# Altium footprint library OneBoxLib_RCL.PcbLib: 50 footprints (part 1 of 4)
Each footprint in its own frame and in the unit in brackets; x right, y up, seen from the top. Pads: shape width x height; smd on the part's side, far side on the other; paste and mask are expansions set on the pad; w line width, h text height; cw(c..) or ccw(c..) is an arc to the next point about the centre after c.
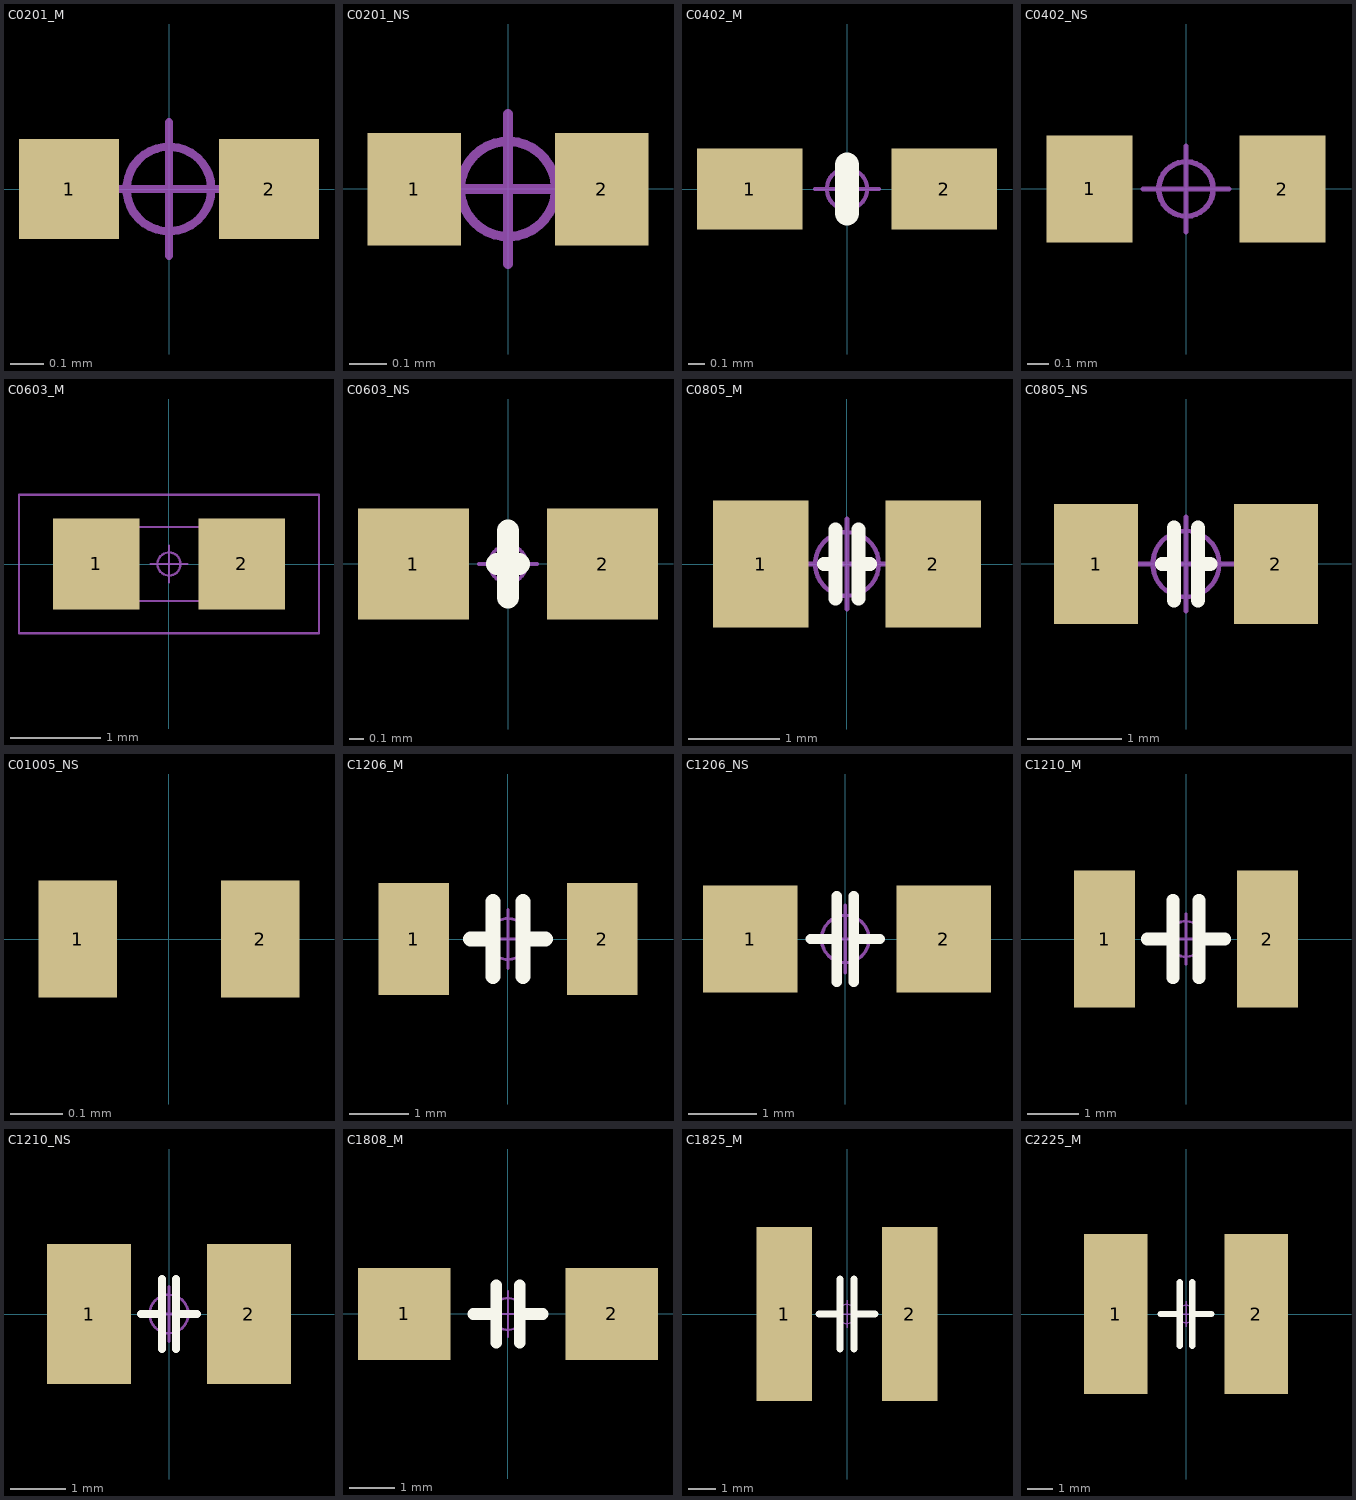
[diagram p0: the footprints below, top view; thin cyan lines are the x and y axes]

## C0201_M [mm] "贴片MLCC电容"
pads (2):
  rect 0.3x0.3 smd: 1(-0.3,0) 2(0.3,0)
Mechanical 15:
  circle w0.025: c0,0 r0.127
  lines w0.025: -0.2,0 0.2,0 ; 0,-0.2 0,0.2
3D body "3D Model.STEP": height 0.34, standoff 0.02, extent -0.3,-0.16 0.3,0.16

## C0201_NS [mm] "贴片MLCC电容-无丝印"
pads (2):
  rect 0.25x0.3 smd: 1(-0.25,0) 2(0.25,0)
Mechanical 15:
  circle w0.025: c0,0 r0.127
  lines w0.025: -0.2,0 0.2,0 ; 0,-0.2 0,0.2
3D body "3D Model.STEP": height 0.34, standoff 0.02, extent -0.3,-0.16 0.3,0.16

## C0402_M [mil] "贴片MLCC电容"
pads (2):
  rect 26x20 smd: 1(-24,0) 2(24,0)
Top Overlay:
  lines w6: 0,-6 0,6
Mechanical 15:
  circle w1: c0,0 r5
  lines w1: -7.87,0 7.87,0 ; 0,-7.87 0,7.87
3D body "C 0402.STEP": height 21.08, standoff 0.61, extent -19.68,-10.23 19.69,10.24

## C0402_NS [mm] "贴片MLCC电容-无丝印"
pads (2):
  rect 0.4x0.5 smd: 1(-0.45,0) 2(0.45,0)
Mechanical 15:
  circle w0.025: c0,0 r0.127
  lines w0.025: -0.2,0 0.2,0 ; 0,-0.2 0,0.2
3D body "C 0402.STEP": height 0.54, standoff 0.02, extent -0.5,-0.26 0.5,0.26

## C0603_M [mm] "贴片MLCC电容-无丝印"
pads (2):
  rect 0.95x1 smd: 1(-0.8,0) 2(0.8,0)
Mechanical 13:
  lines w0.025: -0.838,-0.406 -0.838,0.406 0.762,0.406 0.762,-0.406 -0.838,-0.406
Mechanical 15:
  circle w0.025: c0,0 r0.127
  lines w0.025: -0.2,0 0.2,0 ; 0,-0.2 0,0.2 ; -1.651,-0.762 1.651,-0.762 1.651,0.762 -1.651,0.762 -1.651,-0.762
3D body "C 0603.STEP": height 0.84, standoff 0.02, extent -0.8,-0.41 0.8,0.41

## C0603_NS [mil] "贴片MLCC电容-无丝印"
pads (2):
  rect 30x30 smd: 1(-25.59,0) 2(25.59,0)
Top Overlay:
  lines w6: -3,0 0,0 3,0 ; 0,-9 0,9
Mechanical 15:
  circle w1: c0,0 r5
  lines w1: -7.87,0 7.87,0 ; 0,-7.87 0,7.87
3D body "C 0603.STEP": height 32.89, standoff 0.61, extent -31.49,-16.14 31.5,16.14

## C0805_M [mm] "贴片MLCC电容"
height 0.5
pads (2):
  rect 1.05x1.4 smd: 1(-0.95,0) 2(0.95,0)
Top Overlay:
  lines w0.152: -0.254,0 -0.127,0 ; -0.127,-0.381 -0.127,0.381 ; 0.127,-0.381 0.127,0.381 ; 0.127,0 0.254,0
Mechanical 15:
  circle w0.05: c0,0 r0.35
  lines w0.05: -0.5,0 0.5,0 ; 0,-0.5 0,0.5
3D body "C0805.STEP": height 0.8, standoff 0, extent -1,-0.625 1,0.625

## C0805_NS [mil] "贴片MLCC电容-无丝印"
height 19.68
pads (2):
  rect 35x50 smd: 1(-37.4,0) 2(37.4,0)
Top Overlay:
  lines w6: -10,0 -5,0 ; -5,-15 -5,15 ; 5,-15 5,15 ; 5,0 10,0
Mechanical 15:
  circle w1.97: c0,0 r13.78
  circle w1.97: c0,0 r13.78
  lines w1.97: -19.68,0 19.68,0 -19.68,0 ; 0,-19.68 0,19.68 0,-19.68
3D body "C 0805.STEP": height 22.08, standoff 1.61, extent -39.36,-24.01 39.38,24.02

## C01005_NS [mm] "贴片MLCC电容-无丝印"
pads (2):
  rect 0.15x0.225 smd paste+0 mask+0: 1(-0.175,0) 2(0.175,0)
3D body "C01005.STEP": height 0.2, standoff 0, extent -0.199,-0.102 0.2,0.098

## C1206_M [mm] "贴片MLCC电容"
pads (2):
  rect 1.2x1.9 smd: 1(-1.6,0) 2(1.6,0)
Top Overlay:
  lines w0.254: -0.635,0 -0.254,0 ; -0.254,-0.635 -0.254,0.635 ; 0.254,-0.635 0.254,0.635 ; 0.254,0 0.635,0
Mechanical 15:
  circle w0.05: c0,0 r0.35
  lines w0.05: -0.5,0 0.5,0 ; 0,-0.5 0,0.5
3D body "User Library-Vhip cap 1206.STEP": height 1.72, standoff -0.02, extent -1.6,-0.85 1.6,0.85

## C1206_NS [mil] "贴片MLCC电容-无丝印"
pads (2):
  rect 55x62 smd: 1(-55.12,0) 2(57.09,0)
Top Overlay:
  lines w6: -20,0 -5,0 ; -5,-25 -5,25 ; 5,-25 5,25 ; 5,0 20,0
Mechanical 15:
  circle w1.97: c0,0 r13.78
  lines w1.97: -19.68,0 19.68,0 ; 0,-19.68 0,19.68
3D body "3D Model.STEP": height 49.64, standoff 1.61, extent -62.99,-31.89 63,31.89

## C1210_M [mm] "贴片MLCC电容"
pads (2):
  rect 1.2x2.7 smd: 1(-1.6,0) 2(1.6,0)
Top Overlay:
  lines w0.254: -0.762,0 -0.254,0 ; -0.254,-0.762 -0.254,0.762 ; 0.254,-0.762 0.254,0.762 ; 0.254,0 0.762,0
Mechanical 15:
  circle w0.05: c0,0 r0.35
  lines w0.05: -0.5,0 0.5,0 ; 0,-0.5 0,0.5

## C1210_NS [mm] "贴片MLCC电容 -无丝印"
pads (2):
  rect 1.524x2.54 smd: 1(-1.45,0) 2(1.45,0)
Top Overlay:
  lines w0.152: -0.508,0 -0.127,0 ; -0.127,-0.635 -0.127,0.635 ; 0.127,-0.635 0.127,0.635 ; 0.127,0 0.508,0
Mechanical 15:
  circle w0.05: c0,0 r0.35
  lines w0.05: -0.5,0 0.5,0 ; 0,-0.5 0,0.5
3D body "C 1210.STEP": height 1.56, standoff 0.03, extent -1.6,-1.285 1.6,1.285

## C1808_M [mil] "贴片MLCC电容"
pads (2):
  rect 80x80 smd: 1(-90,0) 2(90,0)
Top Overlay:
  lines w10: -30,0 -10,0 ; -10,-25 -10,25 ; 10,-25 10,25 ; 10,0 30,0
Mechanical 15:
  circle w1.97: c0,0 r13.78
  lines w1.97: -19.68,0 19.68,0 ; 0,-19.68 0,19.68
3D body "C 1808.STEP": height 61.45, standoff 1.61, extent -90.54,-39.76 90.56,39.77

## C1825_M [mil] "贴片MLCC电容"
pads (2):
  rect 80x250 smd: 1(-90,0) 2(90,0)
Top Overlay:
  lines w10: -40,0 -10,0 ; -10,-50 -10,50 ; 10,-50 10,50 ; 10,0 40,0
Mechanical 15:
  circle w1.97: c0,0 r13.78
  lines w1.97: -19.68,0 19.68,0 ; 0,-19.68 0,19.68
3D body "3D Model.STEP": height 64.39, standoff 0.61, extent -88.58,-125.4 88.59,125.4

## C2225_M [mil] "贴片MLCC电容"
pads (2):
  rect 100x250 smd: 1(-110,0) 2(110,0)
Top Overlay:
  lines w10: -40,0 -10,0 ; -10,-50 -10,50 ; 10,-50 10,50 ; 10,0 40,0
Mechanical 15:
  circle w1.97: c0,0 r13.78
  lines w1.97: -19.68,0 19.68,0 ; 0,-19.68 0,19.68
3D body "C 2225.STEP": height 65.39, standoff 1.61, extent -110.23,-125.39 110.24,125.4